# Altium footprint library generated_footprints.PcbLib: 38 footprints (part 1 of 3)
Each footprint in its own frame and in the unit in brackets; x right, y up, seen from the top. Pads: shape width x height; smd on the part's side, far side on the other; paste and mask are expansions set on the pad; w line width, h text height; cw(c..) or ccw(c..) is an arc to the next point about the centre after c.
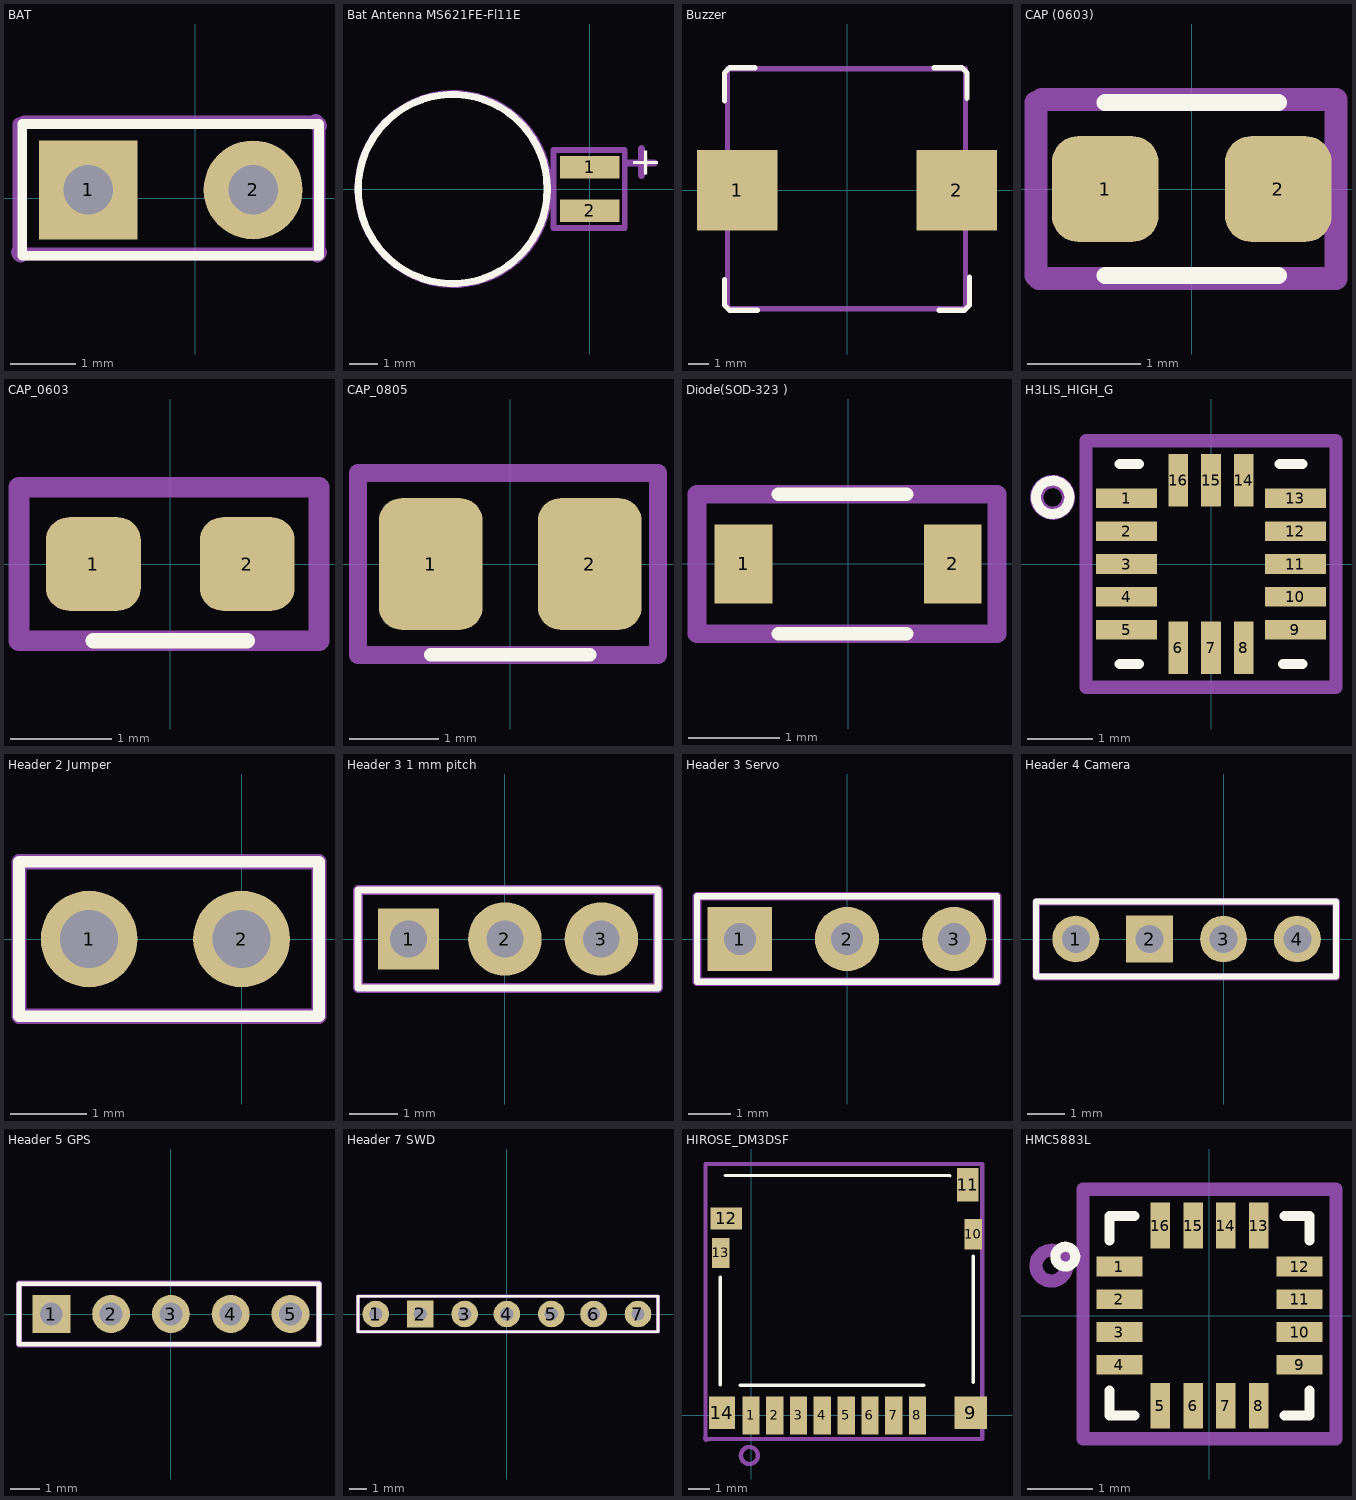
[diagram p0: the footprints below, top view; thin cyan lines are the x and y axes]

## BAT [mil]
pads (2):
  rect 60x60 hole 30: 1(-65,5)
  round 60 hole 30: 2(35,5)
Top Overlay:
  lines w6: -105,-35 -105,45 75,45 75,-35 -105,-35
Mechanical 15:
  lines w8: -107,-33 -107,45 ; -106,-34 74,-34 ; -104,46 73,46 ; 75,-33 75,44
  lines w10: -107,-33 -106,-34 ; 73,46 75,44 ; 74,-34 75,-33
  text ".Designator" at -38,-6 h30
3D body "User Library-1x2 TH Pitch 2_54mm.step": height 373.85, standoff -125.98, extent -115,-45 85,55

## Bat Antenna MS621FE-Fl11E [mm]
pads (2):
  rect 2.1x0.8 smd: 1(0,0.762) 2(0,-0.762)
Top Overlay:
  circle w0.254: c-4.826,0 r3.334
  text "+" at 1.397,0.508 h1.02
Mechanical 15:
  circle w0.254: c-4.801,0 r3.365
  lines w0.203: -1.27,-1.372 1.245,-1.372 1.245,1.372 -1.27,1.372 -1.27,-1.372
  lines w0.254: 1.372,0.914 2.286,0.914 ; 1.829,0.483 1.829,1.422
  text ".Designator" at -5.842,-0.432 h1.52
3D body "User Library-ms621fe.STEP": height 2.65, standoff -0.05, extent -8.226,-3.4 1.074,3.4

## Buzzer [mm]
pads (2):
  rect 4x4 smd mask+0.2: 1(-5.461,0) 2(5.461,0)
Top Overlay:
  lines w0.254: -6.096,-4.445 -6.096,-5.715 -5.842,-5.969 -4.445,-5.969 ; -6.096,4.445 -6.096,5.842 -5.842,6.096 -4.572,6.096 ; 4.318,6.096 5.715,6.096 5.969,5.842 5.969,4.572 ; 4.572,-5.969 5.842,-5.969 6.096,-5.715 6.096,-4.318
Mechanical 15:
  lines w0.254: -5.944,-5.766 -5.817,-5.893 5.893,-5.893 5.893,6.045 -5.944,6.045 -5.944,-5.766
  text ".Designator" at -0.787,-0.483 h1.52
3D body "User Library-PKLCS1212_murata.STEP": height 3.07, standoff 0, extent -6,-6 6,6

## CAP (0603) [mm] "Capacitor, Chip; 1.60 mm L X 0.80 mm W X 0.90 mm H body"
height 0.9
pads (2):
  rrect49% 0.94x0.93 smd: 1(-0.762,0) 2(0.762,0)
Top Overlay:
  lines w0.152: -0.762,-0.762 0.762,-0.762 ; -0.762,0.762 0.762,0.762
Mechanical 15:
  lines w0.203: -1.372,-0.762 -1.372,0.762 ; -1.346,-0.787 1.27,-0.787 1.27,0.787 -1.321,0.787
  text ".Designator" at -0.787,-0.356 h1.52
3D body "SW3DPS-CAPACITOR 0603-DEFAULT.STEP": height 0.83, standoff -0.03, extent -0.8,-0.43 0.8,0.43

## CAP_0603 [mm]
pads (2):
  rrect49% 0.94x0.93 smd: 1(-0.762,0) 2(0.762,0)
Top Overlay:
  lines w0.152: -0.762,-0.762 0.762,-0.762
Mechanical 15:
  lines w0.203: -1.499,-0.762 -1.499,0.762 1.473,0.762 1.473,-0.762 -1.499,-0.762
  text ".Designator" at -1.219,-0.508 h1.52
3D body "SW3DPS-CAPACITOR 0603-DEFAULT.STEP": height 0.43, standoff -0.43, extent -0.8,-0.411 0.8,0.449

## CAP_0805 [mm] "Capacitor, Chip; 2.00 mm L X 1.25 mm W X 1.45 mm H body"
height 1.45
pads (2):
  rrect43% 1.16x1.47 smd: 1(-0.889,0) 2(0.889,0)
Top Overlay:
  lines w0.152: -0.889,-1.016 0.889,-1.016
Mechanical 15:
  lines w0.203: -1.702,-1.016 1.651,-1.016 1.651,1.016 -1.702,1.016 -1.702,-1.016
  text ".Designator" at -1.168,-0.406 h1.52
3D body "SW3DPS-CAPACITOR 0805-DEFAULT.STEP": height 0.73, standoff -0.03, extent -1,-0.655 1,0.655

## Diode(SOD-323 ) [mm]
pads (2):
  rect 0.63x0.86 smd: 1(-1.143,0) 2(1.143,0)
Top Overlay:
  lines w0.152: -0.762,-0.762 0.635,-0.762 ; -0.762,0.762 0.635,0.762
Mechanical 15:
  lines w0.203: -1.651,-0.762 1.626,-0.762 1.626,0.762 -1.651,0.762 -1.651,-0.762
  text ".Designator" at -1.346,-0.533 h1.52
3D body "User Library-SOD323-1.STEP": height 1.1, standoff 0, extent -1.3,-0.675 1.3,0.675

## H3LIS_HIGH_G [mm]
pads (16):
  rect 0.925x0.3 smd paste-25.4 mask-25.4: 1(-1.288,1) 2(-1.288,0.5) 3(-1.288,0) 4(-1.288,-0.5) 5(-1.288,-1) 9(1.288,-1) 10(1.288,-0.5) 11(1.288,0) 12(1.288,0.5) 13(1.288,1)
  rect 0.3x0.8 smd paste-25.4 mask-25.4: 6(-0.5,-1.275) 7(0,-1.275) 8(0.5,-1.275) 14(0.5,1.275) 15(0,1.275) 16(-0.5,1.275)
Top Overlay:
  circle w0.152: c-2.413,1.016 r0.254
  lines w0.152: -1.397,-1.524 -1.097,-1.524 ; -1.397,1.524 -1.097,1.524 ; 1.047,1.524 1.397,1.524 ; 1.097,-1.524 1.397,-1.524
Top Paste:
  region: -0.35,0.875 -0.35,1.675 -0.65,1.675 -0.65,0.875
  region: 0.15,0.875 0.15,1.675 -0.15,1.675 -0.15,0.875
  region: 0.65,0.875 0.65,1.675 0.35,1.675 0.35,0.875
  region: 0.825,0.85 1.75,0.85 1.75,1.15 0.825,1.15
  region: 0.825,0.35 1.75,0.35 1.75,0.65 0.825,0.65
  region: 0.825,-0.15 1.75,-0.15 1.75,0.15 0.825,0.15
  region: 0.825,-0.65 1.75,-0.65 1.75,-0.35 0.825,-0.35
  region: 0.825,-1.15 1.75,-1.15 1.75,-0.85 0.825,-0.85
  region: 0.65,-1.675 0.65,-0.875 0.35,-0.875 0.35,-1.675
  region: 0.15,-1.675 0.15,-0.875 -0.15,-0.875 -0.15,-1.675
  region: -0.35,-1.675 -0.35,-0.875 -0.65,-0.875 -0.65,-1.675
  region: -1.75,-1.15 -0.825,-1.15 -0.825,-0.85 -1.75,-0.85
  region: -1.75,-0.65 -0.825,-0.65 -0.825,-0.35 -1.75,-0.35
  region: -1.75,-0.15 -0.825,-0.15 -0.825,0.15 -1.75,0.15
  region: -1.75,0.35 -0.825,0.35 -0.825,0.65 -1.75,0.65
  region: -1.75,0.85 -0.825,0.85 -0.825,1.15 -1.75,1.15
Top Solder:
  region: -0.25,0.775 -0.25,1.775 -0.686,1.775 -0.686,0.775
  region: 0.25,0.775 0.25,1.775 -0.25,1.775 -0.25,0.775
  region: 0.686,0.775 0.686,1.775 0.25,1.775 0.25,0.775
  region: 0.787,0.75 1.803,0.75 1.803,1.25 0.787,1.25
  region: 0.787,0.25 1.803,0.25 1.803,0.75 0.787,0.75
  region: 0.787,-0.25 1.803,-0.25 1.803,0.25 0.787,0.25
  region: 0.787,-0.75 1.803,-0.75 1.803,-0.25 0.787,-0.25
  region: 0.787,-1.25 1.803,-1.25 1.803,-0.75 0.787,-0.75
  region: 0.686,-1.775 0.686,-0.775 0.25,-0.775 0.25,-1.775
  region: 0.25,-1.775 0.25,-0.775 -0.25,-0.775 -0.25,-1.775
  region: -0.25,-1.775 -0.25,-0.775 -0.686,-0.775 -0.686,-1.775
  region: -1.803,-1.25 -0.787,-1.25 -0.787,-0.75 -1.803,-0.75
  region: -1.803,-0.75 -0.787,-0.75 -0.787,-0.25 -1.803,-0.25
  region: -1.803,-0.25 -0.787,-0.25 -0.787,0.25 -1.803,0.25
  region: -1.803,0.25 -0.787,0.25 -0.787,0.75 -1.803,0.75
  region: -1.803,0.75 -0.787,0.75 -0.787,1.25 -1.803,1.25
Mechanical 15:
  circle w0.203: c-2.413,1.016 r0.241
  lines w0.203: -1.905,-1.88 -1.905,1.88 1.905,1.88 1.905,-1.88 -1.905,-1.88
  text ".Designator" at -0.965,-0.356 h1.52
3D body "User Library-LIS331AL.STEP": height 1.01, standoff -0.01, extent -1.5,-1.525 1.5,1.475

## Header 2 Jumper [mil]
pads (2):
  round 50 hole 30: 1(-78.74,0) 2(0,0)
Top Overlay:
  lines w6: -115,-40 40,-40 40,40 -115,40 -115,-40
Mechanical 15:
  lines w8: -115,-40 40,-40 40,40 -115,40 -115,-40
  text ".Designator" at -100,0 h60

## Header 3 1 mm pitch [mil]
pads (3):
  rect 50x50 hole 30: 1(-78.74,0)
  round 60 hole 30: 2(0,0) 3(78.74,0)
Top Overlay:
  lines w6: -120,-40 -120,40 125,40 125,-40 -120,-40
Mechanical 15:
  lines w8: -120,-40 125,-40 125,40 -120,40 -120,-40

## Header 3 Servo [mil]
pads (3):
  rect 60x60 hole 30: 1(-100,0)
  round 60 hole 30: 2(0,0) 3(100,0)
Top Overlay:
  lines w6: -140,-40 -140,40 140,40 140,-40 -140,-40
Mechanical 15:
  lines w8: -140,-40 140,-40 140,40 -140,40 -140,-40
  text ".Designator" at -59,-19 h60
3D body "User Library-1x3 TH Pitch 2_54mm.STEP": height 377.78, standoff -122.05, extent -150,-50 150,50

## Header 4 Camera [mil]
pads (4):
  round 50 hole 30: 1(-157.48,0) 3(0,0) 4(78.74,0)
  rect 50x50 hole 30: 2(-78.74,0)
Top Overlay:
  lines w6: -200,-40 120,-40 120,40 -200,40 -200,-40
Mechanical 15:
  lines w8: -200,-40 120,-40 120,40 -200,40 -200,-40

## Header 5 GPS [mil]
pads (5):
  rect 50x50 hole 30: 1(-157.48,0)
  round 50 hole 30: 2(-78.74,0) 3(0,0) 4(78.74,0) 5(157.48,0)
Top Overlay:
  lines w6: -200,-40 -200,40 195,40 195,-40 -200,-40
Mechanical 15:
  lines w8: -200,-40 -200,40 195,40 195,-40 -200,-40

## Header 7 SWD [mil]
pads (7):
  round 60 hole 30: 1(-295,0) 3(-95,0) 4(0,0) 5(100,0) 6(195,0) 7(295,0)
  rect 60x60 hole 30: 2(-195,0)
Top Overlay:
  lines w6: -335,-40 340,-40 340,40 -335,40 -335,-40
Mechanical 15:
  lines w8: -335,-40 -335,40 340,40 340,-40 -335,-40
  text ".Designator" at -100,-15 h60

## HIROSE_DM3DSF [mm]
pads (14):
  rect 0.8x1.75 smd mask+0.089: 1(0,0) 2(1.1,0) 3(2.2,0) 4(3.3,0) 5(4.4,0) 6(5.5,0) 7(6.6,0) 8(7.7,0)
  rect 1.5x1.5 smd: 9(10.16,0.127)
  rect 0.8x1.4 smd: 10(10.287,8.382) 13(-1.397,7.518)
  rect 1x1.55 smd paste-25.4 mask-25.4: 11(10.033,10.668)
  rect 1.45x1 smd paste-25.4 mask-25.4: 12(-1.15,9.112)
  rect 1.2x1.5 smd mask+0.089: 14(-1.346,0.127)
Top Overlay:
  lines w0.152: -1.422,1.422 -1.422,6.401 ; -1.194,11.1 9.206,11.089 ; -0.508,1.397 8.001,1.397 ; 10.287,1.524 10.287,7.366
Top Paste:
  region: 9.533,9.893 10.533,9.893 10.533,11.443 9.533,11.443
  region: -0.425,8.612 -0.425,9.612 -1.875,9.612 -1.875,8.612
Top Solder:
  region: 9.433,9.793 10.633,9.793 10.633,11.543 9.433,11.543
  region: -0.325,8.512 -0.325,9.712 -1.975,9.712 -1.975,8.512
Mechanical 15:
  circle w0.203: c-0.076,-1.854 r0.394
  lines w0.203: -2.108,-1.067 -2.108,11.633 10.693,11.633 10.693,-0.991 ; -2.083,-1.092 10.693,-1.092
  lines w0.254: -2.108,-1.067 -2.083,-1.092
  text ".Designator" at 2.235,5.436 h1.52
3D body "DM3D-SF.stp": height 1.55, standoff 0, extent -1.403,-0.381 10.547,11.069

## HMC5883L [mm]
pads (16):
  rect 0.7x0.3 smd paste-25.4 mask-25.4: 1(-1.375,0.75) 2(-1.375,0.25) 3(-1.375,-0.25) 4(-1.375,-0.75) 9(1.375,-0.75) 10(1.375,-0.25) 11(1.375,0.25) 12(1.375,0.75)
  rect 0.3x0.7 smd paste-25.4 mask-25.4: 5(-0.75,-1.375) 6(-0.25,-1.375) 7(0.25,-1.375) 8(0.75,-1.375) 13(0.75,1.375) 14(0.25,1.375) 15(-0.25,1.375) 16(-0.75,1.375)
Top Overlay:
  circle w0.152: c-2.2,0.9 r0.152
  lines w0.152: -1.524,-1.143 -1.524,-1.524 -1.143,-1.524 ; -1.524,1.143 -1.524,1.524 -1.143,1.524 ; 1.143,-1.524 1.524,-1.524 1.524,-1.143 ; 1.143,1.524 1.524,1.524 1.524,1.143
Top Paste:
  region: -1.725,0.6 -1.025,0.6 -1.025,0.9 -1.725,0.9
  region: -1.725,0.1 -1.025,0.1 -1.025,0.4 -1.725,0.4
  region: -1.725,-0.4 -1.025,-0.4 -1.025,-0.1 -1.725,-0.1
  region: -1.725,-0.9 -1.025,-0.9 -1.025,-0.6 -1.725,-0.6
  region: -0.6,-1.725 -0.6,-1.025 -0.9,-1.025 -0.9,-1.725
  region: -0.1,-1.725 -0.1,-1.025 -0.4,-1.025 -0.4,-1.725
  region: 0.4,-1.725 0.4,-1.025 0.1,-1.025 0.1,-1.725
  region: 0.9,-1.725 0.9,-1.025 0.6,-1.025 0.6,-1.725
  region: 1.725,-0.6 1.025,-0.6 1.025,-0.9 1.725,-0.9
  region: 1.725,-0.1 1.025,-0.1 1.025,-0.4 1.725,-0.4
  region: 1.725,0.4 1.025,0.4 1.025,0.1 1.725,0.1
  region: 1.725,0.9 1.025,0.9 1.025,0.6 1.725,0.6
  region: 0.6,1.725 0.6,1.025 0.9,1.025 0.9,1.725
  region: 0.1,1.725 0.1,1.025 0.4,1.025 0.4,1.725
  region: -0.4,1.725 -0.4,1.025 -0.1,1.025 -0.1,1.725
  region: -0.9,1.725 -0.9,1.025 -0.6,1.025 -0.6,1.725
Top Solder:
  region: -1.825,0.5 -0.925,0.5 -0.925,1 -1.825,1
  region: -1.825,0 -0.925,0 -0.925,0.5 -1.825,0.5
  region: -1.825,-0.5 -0.925,-0.5 -0.925,0 -1.825,0
  region: -1.825,-1 -0.925,-1 -0.925,-0.5 -1.825,-0.5
  region: -0.5,-1.825 -0.5,-0.925 -1,-0.925 -1,-1.825
  region: 0,-1.825 0,-0.925 -0.5,-0.925 -0.5,-1.825
  region: 0.5,-1.825 0.5,-0.925 0,-0.925 0,-1.825
  region: 1,-1.825 1,-0.925 0.5,-0.925 0.5,-1.825
  region: 1.825,-0.5 0.925,-0.5 0.925,-1 1.825,-1
  region: 1.825,0 0.925,0 0.925,-0.5 1.825,-0.5
  region: 1.825,0.5 0.925,0.5 0.925,0 1.825,0
  region: 1.825,1 0.925,1 0.925,0.5 1.825,0.5
  region: 0.5,1.825 0.5,0.925 1,0.925 1,1.825
  region: 0,1.825 0,0.925 0.5,0.925 0.5,1.825
  region: -0.5,1.825 -0.5,0.925 0,0.925 0,1.825
  region: -1,1.825 -1,0.925 -0.5,0.925 -0.5,1.825
Mechanical 15:
  circle w0.203: c-2.413,0.762 r0.234
  lines w0.203: 1.905,1.93 -1.93,1.93 -1.93,-1.88 1.93,-1.88 1.93,1.93
  text ".Designator" at -0.61,-0.457 h1.52